# Altium footprint library 我的器件.PCBLIB: 450 footprints (part 24 of 29)
Each footprint in its own frame and in the unit in brackets; x right, y up, seen from the top. Pads: shape width x height; smd on the part's side, far side on the other; paste and mask are expansions set on the pad; w line width, h text height; cw(c..) or ccw(c..) is an arc to the next point about the centre after c.
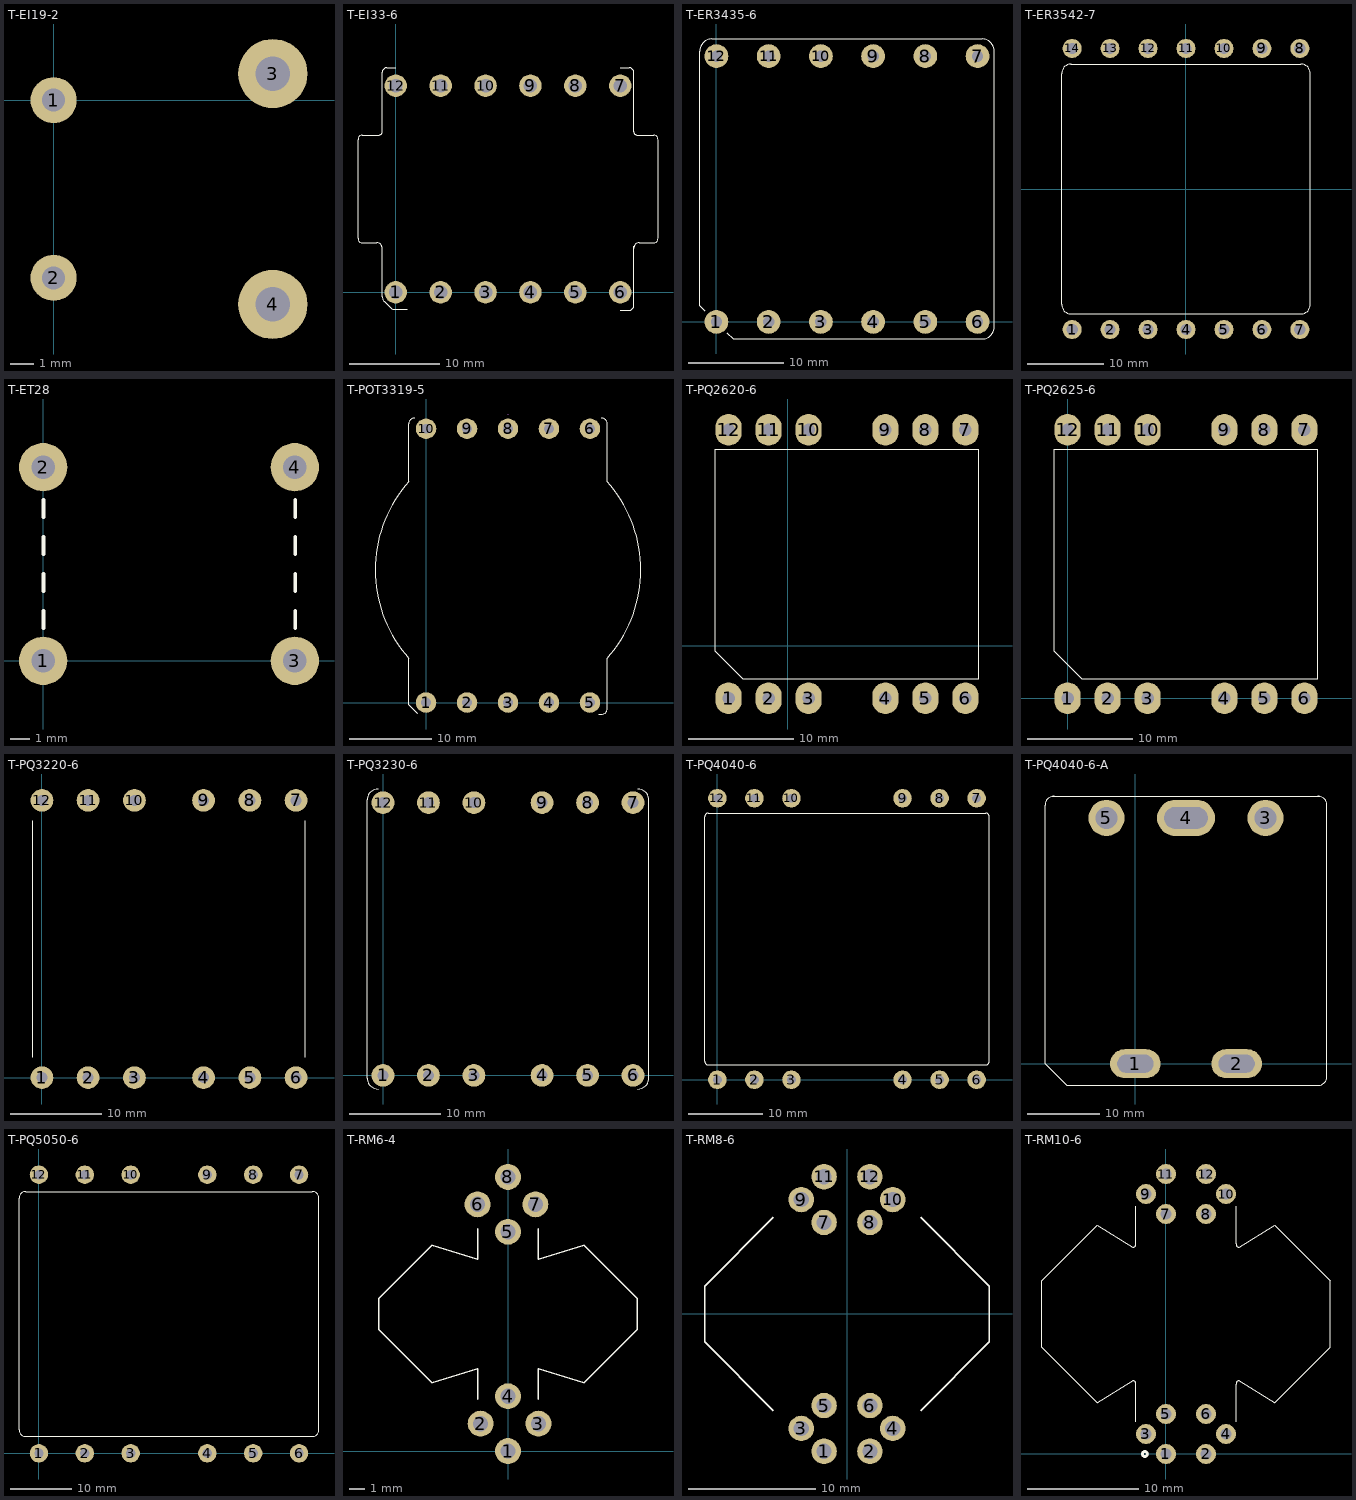
[diagram p23: the footprints below, top view; thin cyan lines are the x and y axes]

## T-EI19-2 [mm]
pads (4):
  round 2 hole 1: 1(0,0) 2(0,-7.7)
  round 3 hole 1.5: 3(9.5,1.15) 4(9.5,-8.85)
3D body: height 16, standoff 4, extent 2.95,-6.838 8.45,-0.85
3D body: height 9.99, standoff 4.01, extent 2.95,-9.826 8.45,-3.85
3D body: height 15.99, standoff 10.01, extent 2.95,-9.826 8.45,-3.85
3D body: height 15.99, standoff 10.01, extent 2.95,-3.826 8.45,2.15
3D body: height 13, standoff 7, extent 2.95,-9.85 8.45,2.15
3D body: height 9.99, standoff 4.01, extent 2.95,-3.826 8.45,2.15
3D body: height 3, standoff -2, extent 8.905,-9.449 10.1,-8.251
3D body: height 3, standoff -2, extent 8.905,0.551 10.1,1.749
3D body: height 3, standoff -2, extent -0.397,-8.099 0.4,-7.301
3D body: height 3, standoff -2, extent -0.397,-0.399 0.4,0.399
3D body: height 17.5, standoff 4, extent 1.95,-10.7 2.95,3
3D body: height 17.5, standoff 4, extent 8.45,-10.7 9.45,3
3D body: height 16, standoff 4, extent 8.45,-10.7 11.45,3
3D body: height 6.6, standoff 1.5, extent -1.25,-10.7 2.95,3
3D body: height 6.6, standoff 1.5, extent 8.45,-10.7 13.15,3
3D body: height 1.5, standoff 0, extent -1.25,-10.7 2.95,-9
3D body: height 1.5, standoff 0, extent -1.25,1.3 2.95,3
3D body: height 1.5, standoff 0, extent 8.4,-5.4 13.1,-2.6
3D body: height 12, standoff 7, extent -2.625,-13.55 13.975,5.85
3D body: height 17.5, standoff 13.5, extent 0.95,-10.7 2.95,3
3D body: height 12, standoff 7, extent -2.65,-13.575 14,-13.55
3D body: height 12, standoff 7, extent -2.65,5.85 14,5.875
3D body: height 12, standoff 7, extent 13.975,-13.55 14,5.85
3D body: height 12, standoff 7, extent -2.65,-13.55 -2.625,5.85

## T-EI33-6 [mm]
pads (12):
  round 2.5 hole 1.5: 1(0,0) 2(5,0) 3(10,0) 4(15,0) 5(20,0) 6(25,0) 7(25,23) 8(20,23) 9(15,23) 10(10,23) 11(5,23) 12(0,23)
Top Overlay:
  lines w0.05: 0,25 -1,25 ccw(c-1,24.5) -1.5,24.5 -1.5,17.9 cw(c-1.9,17.9) -1.9,17.5 -3.7,17.5 ccw(c-3.7,17) -4.2,17 -4.2,6 ccw(c-3.7,6) -3.7,5.5 -2.1,5.5 cw(c-2.1,4.9) -1.5,4.9 -1.5,-0.517 ccw(c-0.817,-0.517) -1.3,-1 -0.612,-1.688 ccw(c-0.1,-1.176) -0.1,-1.9 1.3,-1.9 ; 25,-2 26,-2 ccw(c26,-1.5) 26.5,-1.5 26.5,5.1 ; 25,25 26,25 cw(c26,24.5) 26.5,24.5 26.5,17.9 ccw(c26.9,17.9) 26.9,17.5 28.7,17.5 cw(c28.7,17) 29.2,17 29.2,6 cw(c28.7,6) 28.7,5.5 27.1,5.5 ccw(c27.1,4.9) 26.5,4.9
3D body: height 24.5, standoff 8.5, extent 2.5,0.8 22.4,23.8
3D body: height 26, standoff 24.5, extent 1.5,-2.8 23.4,25.8
3D body: height 8.5, standoff 7.5, extent 0.5,4.9 24.5,18.1
3D body: height 8.5, standoff 4.4, extent -1.8,18.1 26.8,25.8
3D body: height 8.5, standoff 4.4, extent -1.8,-2.8 26.8,4.9
3D body: height 7.6, standoff 1, extent -4.5,5.2 29.5,17.8
3D body: height 31.5, standoff 25.5, extent -4.548,5.201 29.452,17.801
3D body: height 31.5, standoff 1, extent 25.1,5.2 29.5,17.8
3D body: height 31.5, standoff 1, extent -4.5,5.2 -0.1,17.8

## T-ER3435-6 [mm]
pads (12):
  round 2.5 hole 1.2: 1(0,0) 2(5.5,0) 3(11,0) 4(16.5,0) 5(22,0) 6(27.5,0) 7(27.5,28) 8(22,28) 9(16.5,28) 10(11,28) 11(5.5,28) 12(0,28)
Top Overlay:
  lines w0.1: -1.25,1.2 -1.75,1.7 -1.75,28.53 cw(c-0.48,28.53) -0.48,29.8 27.98,29.8 cw(c27.98,28.53) 29.25,28.53 29.25,-0.53 cw(c27.98,-0.53) 27.98,-1.8 1.75,-1.8 ; 1.1,-1.15 1.75,-1.8 ; 4.55,-1.8 1.75,-1.8
3D body: height 20.51, standoff 9.49, extent 25.95,13.975 30.975,14.025
3D body: height 20.51, standoff 9.49, extent -3.475,13.975 1.55,14.025
3D body: height 5, standoff -2, extent -0.5,27.501 0.496,28.499
3D body: height 5, standoff -2, extent 5,27.501 5.996,28.499
3D body: height 5, standoff -2, extent 10.5,27.501 11.496,28.499
3D body: height 5, standoff -2, extent 16,27.501 16.996,28.499
3D body: height 5, standoff -2, extent 21.5,27.501 22.496,28.499
3D body: height 5, standoff -2, extent 27,27.501 27.996,28.499
3D body: height 5, standoff -2, extent 27,-0.499 27.996,0.499
3D body: height 5, standoff -2, extent 21.5,-0.499 22.496,0.499
3D body: height 5, standoff -2, extent 16,-0.499 16.996,0.499
3D body: height 5, standoff -2, extent 10.5,-0.499 11.496,0.499
3D body: height 5, standoff -2, extent 5,-0.499 5.996,0.499
3D body: height 20.39, standoff 9.61, extent 8.393,-3.5 19.15,31.5
3D body: height 20.5, standoff 9.5, extent -3.45,-3.5 30.95,14
3D body: height 20.5, standoff 9.5, extent -3.45,14 30.95,31.5
3D body: height 9, standoff 4, extent 30.15,4.4 31.15,23.6
3D body: height 9, standoff 8, extent 25.75,4.4 31.15,23.6
3D body: height 25, standoff 9, extent 24.75,4.4 25.75,23.6
3D body: height 25, standoff 9, extent 1.75,4.4 2.75,23.6
3D body: height 9, standoff 8, extent -3.65,4.4 1.75,23.6
3D body: height 9, standoff 4, extent -3.65,-3.4 31.15,4.4
3D body: height 9, standoff 4, extent -3.65,23.6 31.15,31.4
3D body: height 4, standoff 0, extent 13.1,-3.4 14.4,4.4
3D body: height 4, standoff 0, extent 18.6,-3.4 19.9,4.4
3D body: height 4, standoff 0, extent 24.1,-3.4 25.4,4.4
3D body: height 4, standoff 0, extent 7.6,-3.4 8.9,4.4
3D body: height 4, standoff 0, extent 2.1,-3.4 3.4,4.4
3D body: height 4, standoff 0, extent 24.1,23.6 25.4,31.4
3D body: height 4, standoff 0, extent 18.6,23.6 19.9,31.4
3D body: height 4, standoff 0, extent 2.1,23.6 3.4,31.4
3D body: height 4, standoff 0, extent 7.6,23.6 8.9,31.4
3D body: height 4, standoff 0, extent 13.1,23.6 14.4,31.4
3D body: height 9, standoff 4, extent -3.65,4.4 -2.65,23.6
3D body: height 24, standoff 2, extent 3.25,12.7 24.25,13.5
3D body: height 24, standoff 2, extent 3.25,10.5 24.25,11.3
3D body: height 24, standoff 9, extent 1.75,2.3 25.75,4.5
3D body: height 24, standoff 9, extent 1.75,23.5 25.75,25.7
3D body: height 23.48, standoff 5.52, extent 4.785,13.5 22.714,23.5
3D body: height 23.48, standoff 5.52, extent 4.786,4.5 22.715,10.5
3D body: height 22.48, standoff 6.52, extent 5.813,11.3 21.75,12.7
3D body: height 25, standoff 24, extent 1.74,2.29 13.75,25.7
3D body: height 25, standoff 24, extent 13.75,2.29 25.76,25.7
3D body: height 5, standoff -2, extent -0.5,-0.499 0.496,0.499

## T-ER3542-7 [mm]
pads (14):
  round 2.5 hole 1.5: 1(-15,-18.5) 2(-10,-18.5) 3(-5,-18.5) 4(0,-18.5) 5(5,-18.5) 6(10,-18.5) 7(15,-18.5) 8(15,18.5) 9(10,18.5) 10(5,18.5) 11(0,18.5) 12(-5,18.5) 13(-10,18.5) 14(-15,18.5)
Top Overlay:
  lines w0.1: -15.2,16.45 15.105,16.45 cw(c15.105,15.18) 16.375,15.18 16.375,-15.18 cw(c15.105,-15.18) 15.105,-16.45 -15.105,-16.45 cw(c-15.105,-15.18) -16.375,-15.18 -16.375,15.18 cw(c-15.105,15.18) -15.105,16.45
3D body: height 5, standoff -2, extent -15.5,18.001 -14.504,18.999
3D body: height 5, standoff -2, extent -10.5,18.001 -9.504,18.999
3D body: height 5, standoff -2, extent -5.5,18.001 -4.504,18.999
3D body: height 5, standoff -2, extent -0.5,18.001 0.496,18.999
3D body: height 5, standoff -2, extent 4.5,18.001 5.496,18.999
3D body: height 5, standoff -2, extent 9.5,18.001 10.496,18.999
3D body: height 5, standoff -2, extent 14.5,18.001 15.496,18.999
3D body: height 5, standoff -2, extent 14.5,-18.999 15.496,-18.001
3D body: height 5, standoff -2, extent 9.5,-18.999 10.496,-18.001
3D body: height 5, standoff -2, extent 4.5,-18.999 5.496,-18.001
3D body: height 5, standoff -2, extent -0.5,-18.999 0.496,-18.001
3D body: height 5, standoff -2, extent -5.5,-18.999 -4.504,-18.001
3D body: height 5, standoff -2, extent -10.5,-18.999 -9.504,-18.001
3D body: height 5, standoff -2, extent -15.5,-18.999 -14.504,-18.001
3D body: height 20.9, standoff 7.9, extent -17.525,-21.025 17.525,21.025
3D body: height 20.91, standoff 7.89, extent -17.475,-0.1 -12.45,0.1
3D body: height 20.91, standoff 7.89, extent 12.475,-0.1 17.5,0.1
3D body: height 24.32, standoff 4.4, extent -9.975,3.4 9.985,12.7
3D body: height 7.5, standoff 6, extent -16.8,12.7 16.81,20.51
3D body: height 7.5, standoff 6, extent -16.81,-20.51 16.8,-12.7
3D body: height 19.7, standoff 2, extent -11.3,0.1 11.3,1.1
3D body: height 24.7, standoff 19.7, extent -6.31,0.1 6.31,1.1
3D body: height 24.66, standoff 14.7, extent -11.3,0.1 -1.32,1.1
3D body: height 24.66, standoff 14.7, extent 1.32,0.1 11.3,1.1
3D body: height 24.66, standoff 14.7, extent 1.32,2.4 11.3,3.4
3D body: height 24.66, standoff 14.7, extent -11.3,2.4 -1.32,3.4
3D body: height 24.7, standoff 19.7, extent -6.31,2.4 6.31,3.4
3D body: height 19.7, standoff 2, extent -11.3,2.4 11.3,3.4
3D body: height 24.66, standoff 14.7, extent 1.32,12.7 11.3,15
3D body: height 24.7, standoff 19.7, extent 1.32,12.7 6.31,15
3D body: height 19.7, standoff 7.5, extent -11.3,12.7 11.3,15
3D body: height 24.7, standoff 19.7, extent -6.31,12.7 -1.32,15
3D body: height 24.66, standoff 14.7, extent -11.3,12.7 -1.32,15
3D body: height 23.7, standoff 19, extent -2.495,12.7 2.495,15
3D body: height 24.66, standoff 14.7, extent -11.3,-15 -1.32,-12.7
3D body: height 24.7, standoff 19.7, extent -6.31,-15 -1.32,-12.7
3D body: height 19.7, standoff 7.5, extent -11.3,-15 11.3,-12.7
3D body: height 24.7, standoff 19.7, extent 1.32,-15 6.31,-12.7
3D body: height 24.66, standoff 14.7, extent 1.32,-15 11.3,-12.7
3D body: height 23.7, standoff 19, extent -2.495,-15 2.495,-12.7
3D body: height 24.32, standoff 4.4, extent -9.98,-12.7 9.98,0.1
3D body: height 7.5, standoff 0, extent -13.3,15 -11.7,20.5
3D body: height 7.5, standoff 0, extent -8.3,15 -6.7,20.5
3D body: height 7.5, standoff 0, extent -3.3,15 -1.7,20.5
3D body: height 7.5, standoff 0, extent 1.7,15 3.3,20.5
3D body: height 7.5, standoff 0, extent 6.7,15 8.3,20.5
3D body: height 7.5, standoff 0, extent 11.7,15 13.3,20.5
3D body: height 7.5, standoff 4, extent -16.8,12.7 16.81,19.7
3D body: height 21.25, standoff 7.5, extent -6.886,-15 6.886,15.1
3D body: height 7.5, standoff 4, extent -16.81,-19.7 16.8,-12.7
3D body: height 7.5, standoff 0, extent -13.3,-20.5 -11.7,-15
3D body: height 7.5, standoff 0, extent -8.3,-20.5 -6.7,-15
3D body: height 7.5, standoff 0, extent -3.3,-20.5 -1.7,-15
3D body: height 7.5, standoff 0, extent 1.7,-20.5 3.3,-15
3D body: height 7.5, standoff 0, extent 6.7,-20.5 8.3,-15
3D body: height 7.5, standoff 0, extent 11.7,-20.5 13.3,-15
3D body: height 20.9, standoff 7.9, extent -17.5,-21 17.5,21
3D body: height 19.86, standoff 8.9, extent -5.489,-16 5.489,16

## T-ET28 [mm]
height 36
pads (4):
  round 2.5 hole 1.2: 1(0,0) 2(0,10) 3(13,0) 4(13,10)
Top Overlay:
  lines w0.2: 0.023,1.698 0.023,2.587 ; 0.023,3.603 0.023,4.492 ; 0.023,5.508 0.023,6.397 ; 0.023,7.413 0.023,8.302 ; 13.023,1.698 13.023,2.587 ; 13.023,3.603 13.023,4.492 ; 13.023,5.508 13.023,6.397 ; 13.023,7.413 13.023,8.302
3D body: height 10.2, standoff 5.4, extent -8.1,-5.5 21.1,-0.9
3D body: height 31, standoff 29, extent -4,-1.8 17,9.5
3D body: height 10.2, standoff 8.2, extent -4,-1.8 17,9.5
3D body: height 34.2, standoff 5.4, extent 16,-1.6 21.1,2.6
3D body: height 13, standoff 5.4, extent 16,-5.5 21.1,2.6
3D body: height 34.2, standoff 29, extent -8.1,-5.5 21.1,2.6
3D body: height 13, standoff 5.4, extent -8.1,-5.5 -3,2.6
3D body: height 34.2, standoff 5.4, extent -8.1,-1.6 -3,2.6
3D body: height 2.4, standoff 1.4, extent -0.498,-3.8 0.498,0
3D body: height 2.5, standoff -2, extent -0.498,-0.498 0.498,0.5
3D body: height 20.4, standoff 1.9, extent -0.496,-3.799 0.5,-2.801
3D body: height 29.18, standoff 10.42, extent 14.6,-4.363 15.1,14.363
3D body: height 26.19, standoff 13.41, extent 15.1,-1.375 17.2,11.375
3D body: height 29.18, standoff 10.42, extent 6.9,-4.363 7.4,14.363
3D body: height 26.19, standoff 13.41, extent 5.4,-1.375 6.9,11.375
3D body: height 29.18, standoff 10.42, extent 4.9,-4.363 5.4,14.363
3D body: height 28.68, standoff 10.92, extent -2.3,-3.865 4.9,13.865
3D body: height 24.79, standoff 14.81, extent -3.8,0.02 -2.8,9.98
3D body: height 29.18, standoff 10.42, extent -2.8,-4.363 -2.3,14.363
3D body: height 25.79, standoff 13.81, extent -4.3,-0.976 -3.8,10.976
3D body: height 34.2, standoff 31.2, extent -8.1,2.65 21.1,7.35
3D body: height 22.4, standoff 17.2, extent -8.1,2.65 21.1,7.35
3D body: height 34.2, standoff 5.5, extent -8.1,2.65 -5.1,7.35
3D body: height 34.2, standoff 5.5, extent 18.1,2.65 21.1,7.35
3D body: height 8.4, standoff 5.5, extent -8.1,2.65 21.1,7.35
3D body: height 2.4, standoff 0, extent -8.1,3 21.1,7
3D body: height 5.4, standoff 2.4, extent -8.1,-5.5 21.1,15.5
3D body: height 28.68, standoff 10.92, extent 7.4,-3.865 14.6,13.865
3D body: height 20.4, standoff 1.9, extent 12.504,-3.799 13.5,-2.801
3D body: height 2.5, standoff -2, extent 12.502,-0.498 13.498,0.5
3D body: height 2.4, standoff 1.4, extent 12.502,-3.8 13.498,0
3D body: height 20.4, standoff 1.9, extent 12.5,12.801 13.496,13.799
3D body: height 2.5, standoff -2, extent 12.502,9.5 13.498,10.498
3D body: height 2.4, standoff 1.4, extent 12.502,10 13.498,13.8
3D body: height 20.4, standoff 1.9, extent -0.5,12.801 0.496,13.799
3D body: height 2.5, standoff -2, extent -0.498,9.5 0.498,10.498
3D body: height 2.4, standoff 1.4, extent -0.498,10 0.498,13.8

## T-POT3319-5 [mm]
pads (10):
  round 2.5 hole 1.2: 1(0,0) 2(5,0) 3(10,0) 4(15,0) 5(20,0) 6(20,33.4) 7(15,33.4) 8(10,33.4) 9(5,33.4) 10(0,33.4)
Top Overlay:
  lines w0.1: -2.105,5.395 cw(c10,16.176) -2.115,26.945 -2.115,33.985 cw(c-1.4,33.985) -1.4,34.7 ; -2.1,5.395 -2.1,-0.3 -1.1,-1.3 ; 21.1,-1.4 21.5,-1.4 ccw(c21.5,-0.795) 22.105,-0.795 22.105,5.395 ccw(c10,16.176) 22.115,26.945 22.115,33.985 ccw(c21.4,33.985) 21.4,34.7
Mechanical 1:
  lines w0.1: 10,35.201 ccw(c10,35.201) 10,35.201
3D body: height 2, standoff -2, extent 19.603,33.001 20.4,33.799
3D body: height 2, standoff -2, extent 14.603,33.001 15.4,33.799
3D body: height 2, standoff -2, extent 9.603,33.001 10.4,33.799
3D body: height 2, standoff -2, extent 4.603,33.001 5.4,33.799
3D body: height 2, standoff -2, extent -0.397,33.001 0.4,33.799
3D body: height 2, standoff -2, extent 19.603,-0.399 20.4,0.399
3D body: height 2, standoff -2, extent 14.603,-0.399 15.4,0.399
3D body: height 2, standoff -2, extent 9.603,-0.399 10.4,0.399
3D body: height 2, standoff -2, extent 4.603,-0.399 5.4,0.399
3D body: height 2, standoff -2, extent -0.397,-0.399 0.4,0.399
3D body: height 16, standoff 15.4, extent 3,1.701 17,5.701
3D body: height 16, standoff 15.4, extent -2.897,3.225 23,29.173
3D body: height 4.2, standoff 3.4, extent 10,25.901 18.7,28.601
3D body: height 4.2, standoff 3.4, extent 1.3,25.901 10,28.601
3D body: height 4.2, standoff 3.4, extent 10,3.801 18.7,6.501
3D body: height 4.2, standoff 3.4, extent 1.3,3.801 10,6.501
3D body: height 4.2, standoff 2, extent -2.5,-1.799 22.5,3.801
3D body: height 4.2, standoff 2, extent -2.503,28.596 22.5,35.196
3D body: height 4.2, standoff 3.4, extent -2.897,3.227 23,29.175
3D body: height 3, standoff 0, extent -6.7,4.203 26.7,28.196
3D body: height 19.5, standoff 16.5, extent -6.7,4.203 26.7,28.196
3D body: height 19.5, standoff 0, extent 17.4,4.194 26.7,28.196
3D body: height 19.5, standoff 0, extent -6.7,4.194 2.6,28.196
3D body: height 18, standoff 16, extent 2.994,1.695 17,3.701
3D body: height 18, standoff 16, extent 3,28.701 17.006,30.707
3D body: height 16, standoff 15.4, extent 3,26.701 17,30.701
3D body: height 2, standoff 0, extent -2.5,2.801 22.51,3.811
3D body: height 2, standoff 0, extent -2.505,28.591 22.505,29.601
3D body: height 15.4, standoff 4.2, extent -1.707,4.424 21.8,27.978

## T-PQ2620-6 [mm]
pads (12):
  oval 2.5x3 hole 1.2: 1(-5.6,-5) 2(-1.8,-5) 3(2,-5) 4(9.3,-5) 5(13.1,-5) 6(16.9,-5) 7(16.9,20.5) 8(13.1,20.5) 9(9.3,20.5) 10(2,20.5) 11(-1.8,20.5) 12(-5.6,20.5)
Top Overlay:
  lines w0.1: -6.85,-0.55 -4.25,-3.15 18.15,-3.15 18.15,18.65 -6.85,18.65 -6.85,-0.55
3D body: height 6, standoff 3, extent -7.854,-6.757 19.158,22.257
3D body: height 20, standoff 0.5, extent -0.303,1.762 11.65,13.738
3D body: height 20, standoff 16.5, extent -7.65,-1.65 18.95,17.15
3D body: height 5, standoff 0.5, extent -7.65,-1.65 18.95,17.15
3D body: height 3, standoff 0, extent -7.848,-3.351 6.552,1.149
3D body: height 3, standoff 0, extent 4.752,-3.351 19.152,1.149
3D body: height 3, standoff 0, extent -7.848,14.349 6.552,18.849
3D body: height 3, standoff 0, extent 4.752,14.349 19.152,18.849
3D body: height 20, standoff 0.5, extent -7.656,-1.656 -2.644,17.154
3D body: height 20, standoff 0.5, extent 13.949,-1.656 18.961,17.154
3D body: height 19, standoff 16.5, extent -1.848,13.549 5.652,17.949
3D body: height 19, standoff 16.5, extent 5.652,13.549 13.152,17.949
3D body: height 19, standoff 16.5, extent -1.85,-2.45 5.65,1.95
3D body: height 19, standoff 16.5, extent 5.65,-2.45 13.15,1.95
3D body: height 16.5, standoff 15.5, extent -4.948,7.749 7.526,17.957
3D body: height 16.5, standoff 15.5, extent 3.778,7.749 16.252,17.957
3D body: height 16.5, standoff 15.5, extent 3.778,7.749 16.252,17.957
3D body: height 16.5, standoff 15.5, extent -4.95,-2.458 7.524,7.75
3D body: height 16.5, standoff 15.5, extent 3.778,-2.46 16.252,7.749
3D body: height 15.5, standoff 6, extent -4.269,-2.231 15.652,17.729
3D body: height 6, standoff 5, extent -4.866,-2.829 16.25,18.329
3D body: height 3, standoff -2, extent -5.997,-5.399 -5.2,-4.601
3D body: height 3, standoff -2, extent -2.197,-5.399 -1.4,-4.601
3D body: height 3, standoff -2, extent 1.603,-5.399 2.4,-4.601
3D body: height 3, standoff -2, extent 8.903,-5.399 9.7,-4.601
3D body: height 3, standoff -2, extent 12.703,-5.399 13.5,-4.601
3D body: height 3, standoff -2, extent 16.503,-5.399 17.3,-4.601
3D body: height 3, standoff -2, extent 16.503,20.101 17.3,20.899
3D body: height 3, standoff -2, extent 12.703,20.101 13.5,20.899
3D body: height 3, standoff -2, extent 8.903,20.101 9.7,20.899
3D body: height 3, standoff -2, extent 1.603,20.101 2.4,20.899
3D body: height 3, standoff -2, extent -2.197,20.101 -1.4,20.899
3D body: height 3, standoff -2, extent -5.997,20.101 -5.2,20.899

## T-PQ2625-6 [mm]
pads (12):
  oval 2.5x3 hole 1.2: 1(0,0) 2(3.8,0) 3(7.6,0) 4(14.9,0) 5(18.7,0) 6(22.5,0) 7(22.5,25.5) 8(18.7,25.5) 9(14.9,25.5) 10(7.6,25.5) 11(3.8,25.5) 12(0,25.5)
Top Overlay:
  lines w0.1: -1.25,4.45 -1.25,23.65 23.75,23.65 23.75,1.85 1.35,1.85 -1.25,4.45
3D body: height 3, standoff -2, extent -0.397,25.101 0.4,25.899
3D body: height 3, standoff -2, extent 3.403,25.101 4.2,25.899
3D body: height 3, standoff -2, extent 7.203,25.101 8,25.899
3D body: height 3, standoff -2, extent 14.503,25.101 15.3,25.899
3D body: height 3, standoff -2, extent 18.303,25.101 19.1,25.899
3D body: height 3, standoff -2, extent 22.103,25.101 22.9,25.899
3D body: height 3, standoff -2, extent 22.103,-0.399 22.9,0.399
3D body: height 3, standoff -2, extent 18.303,-0.399 19.1,0.399
3D body: height 3, standoff -2, extent 14.503,-0.399 15.3,0.399
3D body: height 3, standoff -2, extent 7.203,-0.399 8,0.399
3D body: height 3, standoff -2, extent 3.403,-0.399 4.2,0.399
3D body: height 3, standoff -2, extent -0.397,-0.399 0.4,0.399
3D body: height 6, standoff 5, extent 0.734,2.171 21.85,23.329
3D body: height 20.5, standoff 6, extent 1.331,2.769 21.252,22.729
3D body: height 21.5, standoff 20.5, extent 9.378,2.54 21.852,12.749
3D body: height 21.5, standoff 20.5, extent 0.65,2.542 13.124,12.75
3D body: height 21.5, standoff 20.5, extent 9.378,12.749 21.852,22.957
3D body: height 21.5, standoff 20.5, extent 9.378,12.749 21.852,22.957
3D body: height 21.5, standoff 20.5, extent 0.652,12.749 13.126,22.957
3D body: height 24, standoff 21.5, extent 11.25,2.55 18.75,6.95
3D body: height 24, standoff 21.5, extent 3.75,2.55 11.25,6.95
3D body: height 24, standoff 21.5, extent 11.252,18.549 18.752,22.949
3D body: height 24, standoff 21.5, extent 3.752,18.549 11.252,22.949
3D body: height 25, standoff 0.5, extent 19.549,3.344 24.561,22.154
3D body: height 25, standoff 0.5, extent -2.056,3.344 2.956,22.154
3D body: height 3, standoff 0, extent 10.352,19.349 24.752,23.849
3D body: height 3, standoff 0, extent -2.248,19.349 12.152,23.849
3D body: height 3, standoff 0, extent 10.352,1.649 24.752,6.149
3D body: height 3, standoff 0, extent -2.248,1.649 12.152,6.149
3D body: height 5, standoff 0.5, extent -2.05,3.35 24.55,22.15
3D body: height 25, standoff 21.5, extent -2.05,3.35 24.55,22.15
3D body: height 25, standoff 0.5, extent 5.297,6.762 17.25,18.738
3D body: height 6, standoff 3, extent -2.254,-1.757 24.758,27.257

## T-PQ3220-6 [mm]
pads (12):
  round 2.5 hole 1.2: 1(0,0) 2(5.075,0) 3(10.175,0) 4(17.775,0) 5(22.875,0) 6(27.95,0) 7(27.95,30.5) 8(22.875,30.5) 9(17.775,30.5) 10(10.175,30.5) 11(5.075,30.5) 12(0,30.5)
Top Overlay:
  lines w0.1: -1.025,2.25 -1.025,28.25 ; 28.975,2.25 28.975,28.25
3D body: height 3, standoff -2, extent -0.447,-0.399 0.35,0.399
3D body: height 3, standoff -2, extent 4.628,-0.399 5.425,0.399
3D body: height 3, standoff -2, extent 9.728,-0.399 10.525,0.399
3D body: height 3.4, standoff 1, extent -2.023,21.77 13.975,27.75
3D body: height 5.4, standoff 3.4, extent -2.035,21.77 13.975,32.354
3D body: height 17, standoff 16, extent 0.725,15.25 13.975,28.55
3D body: height 20, standoff 17, extent 5.071,21.77 13.975,28.55
3D body: height 3.4, standoff 1, extent 13.975,21.77 29.973,27.75
3D body: height 5.4, standoff 3.4, extent 13.975,21.77 29.985,32.354
3D body: height 17, standoff 16, extent 13.975,15.25 27.225,28.55
3D body: height 20, standoff 17, extent 13.975,21.77 22.879,28.55
3D body: height 3.4, standoff 1, extent -2.023,2.75 13.975,8.73
3D body: height 5.4, standoff 3.4, extent -2.035,-1.854 13.975,8.73
3D body: height 17, standoff 16, extent 0.725,1.95 13.975,15.25
3D body: height 20, standoff 17, extent 5.071,1.95 13.975,8.73
3D body: height 20, standoff 17, extent 13.975,1.95 22.879,8.73
3D body: height 4.3, standoff 0, extent -2.025,4.25 29.975,26.25
3D body: height 21.3, standoff 0, extent 23.975,4.25 29.975,26.25
3D body: height 21.3, standoff 0, extent -2.025,4.25 3.975,26.25
3D body: height 21.3, standoff 17, extent -2.025,4.25 29.975,26.25
3D body: height 17, standoff 16, extent 13.975,1.95 27.225,15.25
3D body: height 5.4, standoff 3.4, extent 13.975,-1.854 29.985,8.73
3D body: height 3.4, standoff 1, extent 13.975,2.75 29.973,8.73
3D body: height 16, standoff 6.4, extent 1.988,3.253 25.975,27.247
3D body: height 6.4, standoff 5.4, extent -2.025,1.95 29.975,15.25
3D body: height 6.4, standoff 5.4, extent -2.025,15.25 29.975,28.55
3D body: height 3, standoff -2, extent 17.425,-0.4 18.225,0.4
3D body: height 3, standoff -2, extent 22.525,-0.4 23.325,0.4
3D body: height 3, standoff -2, extent 27.6,-0.4 28.4,0.4
3D body: height 3, standoff -2, extent 9.725,30.1 10.525,30.9
3D body: height 3, standoff -2, extent 4.625,30.1 5.425,30.9
3D body: height 3, standoff -2, extent -0.45,30.1 0.35,30.9
3D body: height 3, standoff -2, extent 17.425,30.1 18.225,30.9
3D body: height 3, standoff -2, extent 22.525,30.1 23.325,30.9
3D body: height 3, standoff -2, extent 27.6,30.1 28.4,30.9

## T-PQ3230-6 [mm]
pads (12):
  round 2.5 hole 1.2: 1(0,0) 2(5,0) 3(10,0) 4(17.5,0) 5(22.5,0) 6(27.5,0) 7(27.5,30) 8(22.5,30) 9(17.5,30) 10(10,30) 11(5,30) 12(0,30)
Top Overlay:
  lines w0.1: -0.55,-1.5 cw(c-0.55,-0.3) -1.75,-0.3 -1.75,30.3 cw(c-0.55,30.3) -0.55,31.5 ; 28.05,-1.5 ccw(c28.05,-0.3) 29.25,-0.3 29.25,30.3 ccw(c28.05,30.3) 28.05,31.5
3D body: height 8.5, standoff 4, extent -2.25,4 29.75,26
3D body: height 34, standoff 4, extent 23.75,4 29.75,26
3D body: height 34, standoff 4, extent -2.25,4 3.75,26
3D body: height 34, standoff 29.4, extent -2.25,4 29.75,26
3D body: height 29.3, standoff 28.3, extent 0.5,15 13.75,28.3
3D body: height 29.3, standoff 28.3, extent 13.75,1.7 27,15
3D body: height 29.3, standoff 28.3, extent 0.5,1.7 13.75,15
3D body: height 29.3, standoff 28.3, extent 13.75,15 27,28.3
3D body: height 8.4, standoff 7.4, extent -2.75,15 30.25,28.3
3D body: height 7.4, standoff 3, extent 13.75,21.52 30.25,32.1
3D body: height 3, standoff 0, extent 13.75,21.52 30.254,27.5
3D body: height 3, standoff 0, extent -2.754,21.52 13.75,27.5
3D body: height 7.4, standoff 3, extent -2.75,21.52 13.75,32.1
3D body: height 3, standoff -2, extent 27.1,29.601 27.897,30.399
3D body: height 3, standoff -2, extent 22.1,29.601 22.897,30.399
3D body: height 3, standoff -2, extent 17.1,29.601 17.897,30.399
3D body: height 3, standoff -2, extent 9.6,29.601 10.397,30.399
3D body: height 3, standoff -2, extent 4.6,29.601 5.397,30.399
3D body: height 3, standoff -2, extent -0.4,29.601 0.397,30.399
3D body: height 3, standoff -2, extent 27.103,-0.399 27.9,0.399
3D body: height 3, standoff -2, extent 22.103,-0.399 22.9,0.399
3D body: height 3, standoff -2, extent 17.103,-0.399 17.9,0.399
3D body: height 3, standoff -2, extent 9.603,-0.399 10.4,0.399
3D body: height 3, standoff -2, extent 4.603,-0.399 5.4,0.399
3D body: height 3, standoff -2, extent -0.397,-0.399 0.4,0.399
3D body: height 7.4, standoff 3, extent 13.75,-2.1 30.25,8.48
3D body: height 3, standoff 0, extent 13.75,2.5 30.254,8.48
3D body: height 28.1, standoff 8.4, extent 1.845,3.024 25.75,26.976
3D body: height 3, standoff 0, extent -2.754,2.5 13.75,8.48
3D body: height 7.4, standoff 3, extent -2.75,-2.1 13.75,8.48
3D body: height 8.4, standoff 7.4, extent -2.75,1.7 30.25,15

## T-PQ4040-6 [mm]
pads (12):
  round 2.5 hole 1.2: 1(0,0) 2(5,0) 3(10,0) 4(25,0) 5(30,0) 6(35,0) 7(35,38) 8(30,38) 9(25,38) 10(10,38) 11(5,38) 12(0,38)
Top Overlay:
  lines w0.1: -1.7,2.5 ccw(c-1.2,2.5) -1.2,2 36.2,2 ccw(c36.2,2.5) 36.7,2.5 36.7,35.5 ccw(c36.2,35.5) 36.2,36 -1.2,36 ccw(c-1.2,35.5) -1.7,35.5 -1.7,2.5
3D body: height 4, standoff -2, extent 24.6,37.601 25.397,38.399
3D body: height 4, standoff -2, extent 29.6,37.601 30.397,38.399
3D body: height 43.5, standoff 38, extent 17.5,26.1 30.707,36.9
3D body: height 38, standoff 37, extent 17.5,19 35.3,36.9
3D body: height 4, standoff -2, extent 34.6,37.601 35.397,38.399
3D body: height 10.3, standoff 9, extent 17.5,19 35.3,34.308
3D body: height 9, standoff 0, extent 17.5,26.1 37.5,34.3
3D body: height 9, standoff 3.7, extent 17.5,26.1 37.5,40.004
3D body: height 4, standoff -2, extent 9.603,37.601 10.4,38.399
3D body: height 4, standoff -2, extent 4.603,37.601 5.4,38.399
3D body: height 43.5, standoff 38, extent 4.293,26.1 17.5,36.9
3D body: height 38, standoff 37, extent -0.3,19 17.5,36.9
3D body: height 4, standoff -2, extent -0.397,37.601 0.4,38.399
3D body: height 10.3, standoff 9, extent -0.3,19 17.5,34.308
3D body: height 9, standoff 0, extent -2.5,26.1 17.5,34.3
3D body: height 9, standoff 3.7, extent -2.5,26.1 17.5,40.004
3D body: height 9, standoff 3.7, extent 17.5,-2.004 37.5,11.9
3D body: height 9, standoff 0, extent 17.5,3.7 37.5,11.9
3D body: height 10.3, standoff 9, extent 17.5,3.692 35.3,19
3D body: height 4, standoff -2, extent 34.6,-0.399 35.397,0.399
3D body: height 38, standoff 37, extent 17.5,1.1 35.3,19
3D body: height 43.5, standoff 38, extent 17.5,1.1 30.707,11.9
3D body: height 4, standoff -2, extent 29.6,-0.399 30.397,0.399
3D body: height 4, standoff -2, extent 24.6,-0.399 25.397,0.399
3D body: height 4, standoff -2, extent 9.603,-0.399 10.4,0.399
3D body: height 4, standoff -2, extent 4.603,-0.399 5.4,0.399
3D body: height 43.5, standoff 38, extent 4.293,1.1 17.5,11.9
3D body: height 38, standoff 37, extent -0.3,1.1 17.5,19
3D body: height 4, standoff -2, extent -0.397,-0.399 0.4,0.399
3D body: height 9, standoff 3.7, extent -2.5,-2 17.5,11.9
3D body: height 10.3, standoff 9, extent -0.3,3.692 17.5,19
3D body: height 9, standoff 0, extent -2.5,3.7 17.5,11.9
3D body: height 37, standoff 10.3, extent 0.634,2.034 34.5,35.967
3D body: height 44, standoff 3.8, extent 32,5.25 37.7,32.75
3D body: height 44, standoff 38.8, extent 21,5.246 37.7,32.758
3D body: height 9, standoff 3.8, extent 21,5.246 37.7,32.758
3D body: height 9, standoff 3.8, extent -2.7,5.242 14,32.754
3D body: height 44, standoff 3.8, extent 10.258,11.714 24.8,26.286
3D body: height 44, standoff 38.8, extent -2.7,5.242 14,32.754
3D body: height 44, standoff 3.8, extent -2.7,5.25 3,32.75

## T-PQ4040-6-A [mm]
pads (5):
  oval 7x4 hole 2.5 slot 5 at 0 deg: 1(0,0) 2(14,0)
  round 5 hole 3: 3(18,34) 5(-4,34)
  oval 8x5 hole 3 slot 6 at 0 deg: 4(7,34)
Top Overlay:
  lines w0.1: -11.5,37 25.23,37 cw(c25.23,35.73) 26.5,35.73 26.5,-1.73 cw(c25.23,-1.73) 25.23,-3 -9,-3 -9.5,-3 -10,-2.5 -12.5,0 -12.5,35.73 cw(c-11.23,35.73) -11.23,37 25.5,37
3D body: height 1.6, standoff 0, extent -13.204,-3.5 27.2,37.5
3D body: height 35.8, standoff 34.8, extent 7,-0.9 24.8,17
3D body: height 41.3, standoff 35.8, extent 7,-0.9 20.207,9.9
3D body: height 34.8, standoff 8.1, extent -9.866,0.034 24,33.967
3D body: height 41.8, standoff 1.6, extent 21.5,3.25 27.2,30.75
3D body: height 41.8, standoff 36.6, extent 10.5,3.246 27.2,30.758
3D body: height 6.8, standoff 1.6, extent 10.5,3.246 27.2,30.758
3D body: height 41.8, standoff 1.6, extent -0.242,9.715 14.3,24.286
3D body: height 6.8, standoff 1.6, extent -13.2,3.242 3.5,30.754
3D body: height 41.8, standoff 36.6, extent -13.2,3.242 3.5,30.754
3D body: height 41.8, standoff 1.6, extent -13.2,3.25 -7.5,30.75
3D body: height 41.3, standoff 35.8, extent -6.207,24.1 7,34.9
3D body: height 35.8, standoff 34.8, extent -10.8,17 7,34.9
3D body: height 41.3, standoff 35.8, extent 7,24.1 20.207,34.9
3D body: height 35.8, standoff 34.8, extent 7,17 24.8,34.9
3D body: height 41.3, standoff 35.8, extent -6.207,-0.9 7,9.9
3D body: height 35.8, standoff 34.8, extent -10.8,-0.9 7,17

## T-PQ5050-6 [mm]
pads (12):
  round 3 hole 1.5: 1(0,0) 2(7.5,0) 3(15,0) 4(27.5,0) 5(35,0) 6(42.5,0) 7(42.5,45.5) 8(35,45.5) 9(27.5,45.5) 10(15,45.5) 11(7.5,45.5) 12(0,45.5)
Top Overlay:
  lines w0.1: -3.25,3.85 ccw(c-2.15,3.85) -2.15,2.75 44.65,2.75 ccw(c44.65,3.85) 45.75,3.85 45.75,41.65 ccw(c44.65,41.65) 44.65,42.75 -2.15,42.75 ccw(c-2.15,41.65) -3.25,41.65 -3.25,3.85
3D body: height 6.7, standoff 1, extent -4.25,32.15 21.25,48.25
3D body: height 6.7, standoff 1, extent -4.25,-2.75 21.25,13.35
3D body: height 50, standoff 43, extent -4.25,6.75 46.75,38.75
3D body: height 50, standoff 0, extent 11.329,12.77 31.25,32.73
3D body: height 7, standoff 0, extent -4.25,6.75 46.75,38.75
3D body: height 50, standoff 0, extent -4.25,6.74 3.868,38.75
3D body: height 50, standoff 0, extent 38.632,6.74 46.75,38.75
3D body: height 8.4, standoff 6.7, extent -4.26,3.65 21.25,41.85
3D body: height 6.7, standoff 1, extent 21.25,32.15 46.75,48.25
3D body: height 6.7, standoff 1, extent 21.25,-2.75 46.75,13.35
3D body: height 8.4, standoff 6.7, extent 21.25,3.65 46.76,41.85
3D body: height 42.5, standoff 40.8, extent 0.3,22.75 21.25,41.825
3D body: height 50, standoff 40.8, extent 4.937,32.15 21.25,41.825
3D body: height 50, standoff 40.8, extent 4.937,32.15 21.25,41.825
3D body: height 42.5, standoff 40.8, extent 0.3,22.75 21.25,41.825
3D body: height 50, standoff 40.8, extent 21.25,32.15 37.563,41.825
3D body: height 42.5, standoff 40.8, extent 21.25,22.75 42.2,41.825
3D body: height 42.5, standoff 40.8, extent 0.3,3.675 21.25,22.75
3D body: height 50, standoff 40.8, extent 4.937,3.675 21.25,13.35
3D body: height 50, standoff 40.8, extent 21.25,3.675 37.563,13.35
3D body: height 42.5, standoff 40.8, extent 21.25,3.675 42.2,22.75
3D body: height 40.8, standoff 8.4, extent 1.408,2.79 41.25,42.71

## T-RM6-4 [mm]
pads (8):
  round 1.7 hole 1: 1(0,0) 2(-1.8,1.8) 3(2,1.8) 4(0,3.6) 5(0,14.4) 6(-2,16.2) 7(1.8,16.2) 8(0,18)
Top Overlay:
  lines w0.1: -2,3.4 -2,5.4 -5,4.5 -8.5,8 -8.5,9 -8.5,10 -5,13.5 -2,12.6 -2,14.6 ; 2,3.4 2,5.4 5,4.5 8.5,8 8.5,9 8.5,10 5,13.5 2,12.6 2,14.6
3D body: height 2.9, standoff 1.1, extent -3.5,13.5 3.495,19.304
3D body: height 2.9, standoff 1.1, extent -3.495,-1.304 3.5,4.5
3D body: height 10.4, standoff 2.9, extent -5.794,3.202 5.8,14.798
3D body: height 10.9, standoff 10.4, extent -5.993,3.002 6,14.998
3D body: height 2.9, standoff 2.1, extent -5.993,3.002 6,14.998
3D body: height 13, standoff 11, extent -9.4,3.51 9.4,14.49
3D body: height 2, standoff 0, extent -9.4,3.51 9.4,14.49
3D body: height 13, standoff 0, extent -9.4,3.51 -4.875,14.49
3D body: height 13, standoff 0, extent 4.875,3.51 9.4,14.49
3D body: height 2, standoff -2, extent -2.048,1.551 -1.55,2.05
3D body: height 2, standoff -2, extent -0.248,-0.249 0.25,0.25
3D body: height 2, standoff -2, extent 1.752,1.551 2.25,2.05
3D body: height 2, standoff -2, extent -0.248,3.351 0.25,3.85
3D body: height 2, standoff -2, extent -0.248,14.15 0.25,14.649
3D body: height 2, standoff -2, extent -2.248,15.95 -1.75,16.449
3D body: height 2, standoff -2, extent 1.552,15.95 2.05,16.449
3D body: height 2, standoff -2, extent -0.248,17.75 0.25,18.249

## T-RM8-6 [mm]
pads (12):
  round 2 hole 1.2: 1(-1.8,-10.8) 2(1.8,-10.8) 3(-3.6,-9) 4(3.6,-9) 5(-1.8,-7.2) 6(1.8,-7.2) 7(-1.8,7.2) 8(1.8,7.2) 9(-3.6,9) 10(3.6,9) 11(-1.8,10.8) 12(1.8,10.8)
Top Overlay:
  lines w0.1: -5.8,-7.6 -11.2,-2.2 -11.2,0 -11.2,2.2 -5.8,7.6 ; 5.8,-7.6 11.2,-2.2 11.2,0 11.2,2.2 5.8,7.6
3D body: height 16.5, standoff 13.8, extent -11.5,-7.8 0,0
3D body: height 3, standoff 0, extent -11.5,-7.8 0,0
3D body: height 16.4, standoff 0.1, extent -11.5,-7.805 -5.225,0
3D body: height 16.4, standoff 0.1, extent 5.225,-7.805 11.5,0
3D body: height 3, standoff 0, extent 0,-7.8 11.5,0
3D body: height 16.5, standoff 13.8, extent 0,-7.8 11.5,0
3D body: height 16.5, standoff 13.8, extent 0,0 11.5,7.8
3D body: height 3, standoff 0, extent 0,0 11.5,7.8
3D body: height 16.4, standoff 0.1, extent 5.225,0 11.5,7.805
3D body: height 16.4, standoff 0.1, extent -11.5,0 -5.225,7.805
3D body: height 3, standoff 0, extent -11.5,0 0,7.8
3D body: height 13, standoff 3.9, extent -7.998,-7.991 7.998,8
3D body: height 13.8, standoff 13, extent 0,-8.35 8.4,8.4
3D body: height 13.8, standoff 13, extent -8.4,-8.35 0,8.4
3D body: height 3.5, standoff -2, extent -3.899,8.7 -3.301,9.297
3D body: height 3.5, standoff -2, extent -2.099,10.5 -1.501,11.097
3D body: height 3.5, standoff -2, extent -2.099,6.9 -1.501,7.497
3D body: height 3.5, standoff -2, extent 3.301,8.702 3.899,9.3
3D body: height 3.5, standoff -2, extent 1.501,10.502 2.099,11.1
3D body: height 3.5, standoff -2, extent 1.501,6.902 2.099,7.5
3D body: height 3.5, standoff -2, extent 3.301,-9.3 3.9,-8.702
3D body: height 3.5, standoff -2, extent 1.501,-11.1 2.1,-10.502
3D body: height 3.5, standoff -2, extent 1.501,-7.5 2.1,-6.902
3D body: height 3.9, standoff 3, extent -8.3,0 8.3,12.1
3D body: height 3.9, standoff 3, extent -8.3,-12.1 8.3,0
3D body: height 3.5, standoff -2, extent -2.1,-7.497 -1.501,-6.9
3D body: height 3.5, standoff -2, extent -2.1,-11.097 -1.501,-10.5
3D body: height 3.5, standoff -2, extent -3.9,-9.297 -3.301,-8.7
3D body: height 16.5, standoff 13.8, extent -11.5,0 0,7.8
3D body: height 3, standoff 1.5, extent 0.9,-12.1 4.806,-5.9
3D body: height 3, standoff 1.5, extent -4.806,-12.1 -0.9,-5.9
3D body: height 3, standoff 1.5, extent -4.806,5.9 -0.9,12.1
3D body: height 3, standoff 1.5, extent 0.9,5.9 4.806,12.1

## T-RM10-6 [mm]
pads (12):
  round 1.8 hole 1: 1(0,0) 2(3.6,0) 3(-1.8,1.8) 4(5.4,1.8) 5(0,3.6) 6(3.6,3.6) 7(0,21.6) 8(3.6,21.6) 9(-1.8,23.4) 10(5.4,23.4) 11(0,25.2) 12(3.6,25.2)
Top Overlay:
  circle w0.254: c-1.9,0 r0.224
  lines w0.1: -2.7,2.9 -2.7,6.3 ccw(c-3,6.3) -3,6.6 -6.2,4.6 -11.2,9.6 -11.2,15.6 -6.2,20.6 -3,18.6 ccw(c-3,18.9) -2.7,18.9 -2.7,22.3 ; 6.3,2.9 6.3,6.3 cw(c6.6,6.3) 6.6,6.6 9.8,4.6 14.8,9.6 14.8,15.6 9.8,20.6 6.6,18.6 cw(c6.6,18.9) 6.3,18.9 6.3,22.3
3D body: height 14.7, standoff 3.9, extent -7.989,2.803 11.6,22.397
3D body: height 17.4, standoff 15.5, extent -3.6,4.125 1.8,5.6
3D body: height 15.5, standoff 14.7, extent -8.6,2.232 1.8,12.6
3D body: height 17.4, standoff 15.5, extent 1.8,4.125 7.2,5.6
3D body: height 15.5, standoff 14.7, extent 1.8,2.232 12.2,12.6
3D body: height 17.4, standoff 15.5, extent -3.6,19.6 1.8,21.075
3D body: height 15.5, standoff 14.7, extent -8.6,12.6 1.8,22.968
3D body: height 1.3, standoff 0.5, extent 1.8,19.6 7.2,21.075
3D body: height 15.5, standoff 14.7, extent 1.8,12.6 12.2,22.968
3D body: height 3.9, standoff 1.3, extent -3.6,19.6 1.8,26.8
3D body: height 3.9, standoff 3, extent -8.6,12.6 1.8,21.561
3D body: height 1.3, standoff 0.5, extent -3.6,19.6 1.8,21.075
3D body: height 2, standoff -2, extent -0.3,21.3 0.298,21.899
3D body: height 2, standoff -2, extent -2.1,23.1 -1.502,23.699
3D body: height 2, standoff -2, extent -0.3,24.9 0.298,25.499
3D body: height 3.9, standoff 1.3, extent 1.8,19.6 7.2,26.8
3D body: height 3.9, standoff 3, extent 1.8,12.6 12.2,21.561
3D body: height 17.4, standoff 15.5, extent 1.8,19.6 7.2,21.075
3D body: height 2, standoff -2, extent 3.302,21.3 3.9,21.899
3D body: height 2, standoff -2, extent 5.102,23.1 5.7,23.699
3D body: height 2, standoff -2, extent 3.302,24.9 3.9,25.499
3D body: height 3.9, standoff 1.3, extent -3.6,-1.6 1.8,5.6
3D body: height 3.9, standoff 3, extent -8.6,3.638 1.8,12.6
3D body: height 1.3, standoff 0.5, extent -3.6,4.125 1.8,5.6
3D body: height 2, standoff -2, extent -0.3,3.301 0.298,3.9
3D body: height 2, standoff -2, extent -2.1,1.5 -1.502,2.1
3D body: height 2, standoff -2, extent -0.3,-0.3 0.298,0.3
3D body: height 2, standoff -2, extent 3.302,-0.299 3.9,0.3
3D body: height 2, standoff -2, extent 5.102,1.501 5.7,2.1
3D body: height 2, standoff -2, extent 3.302,3.301 3.9,3.9
3D body: height 1.3, standoff 0.5, extent 1.8,4.125 7.2,5.6
3D body: height 3.9, standoff 3, extent 1.8,3.638 12.2,12.6
3D body: height 3.9, standoff 1.3, extent 1.8,-1.6 7.2,5.6
3D body: height 18.8, standoff 0, extent 9.075,3.6 15.8,21.6
3D body: height 18.8, standoff 0, extent -12.2,3.6 -5.475,21.6
3D body: height 2.9, standoff 0, extent -12.2,3.6 15.8,21.6
3D body: height 18.8, standoff 16, extent -12.2,3.6 15.8,21.6
3D body: height 9.6, standoff 9.5, extent -12.225,3.575 -5.45,21.625
3D body: height 9.6, standoff 9.5, extent 9.05,3.575 15.825,21.625